# Altium footprint library Connectors.PcbLib: 135 footprints (part 2 of 9)
Each footprint in its own frame and in the unit in brackets; x right, y up, seen from the top. Pads: shape width x height; smd on the part's side, far side on the other; paste and mask are expansions set on the pad; w line width, h text height; cw(c..) or ccw(c..) is an arc to the next point about the centre after c.
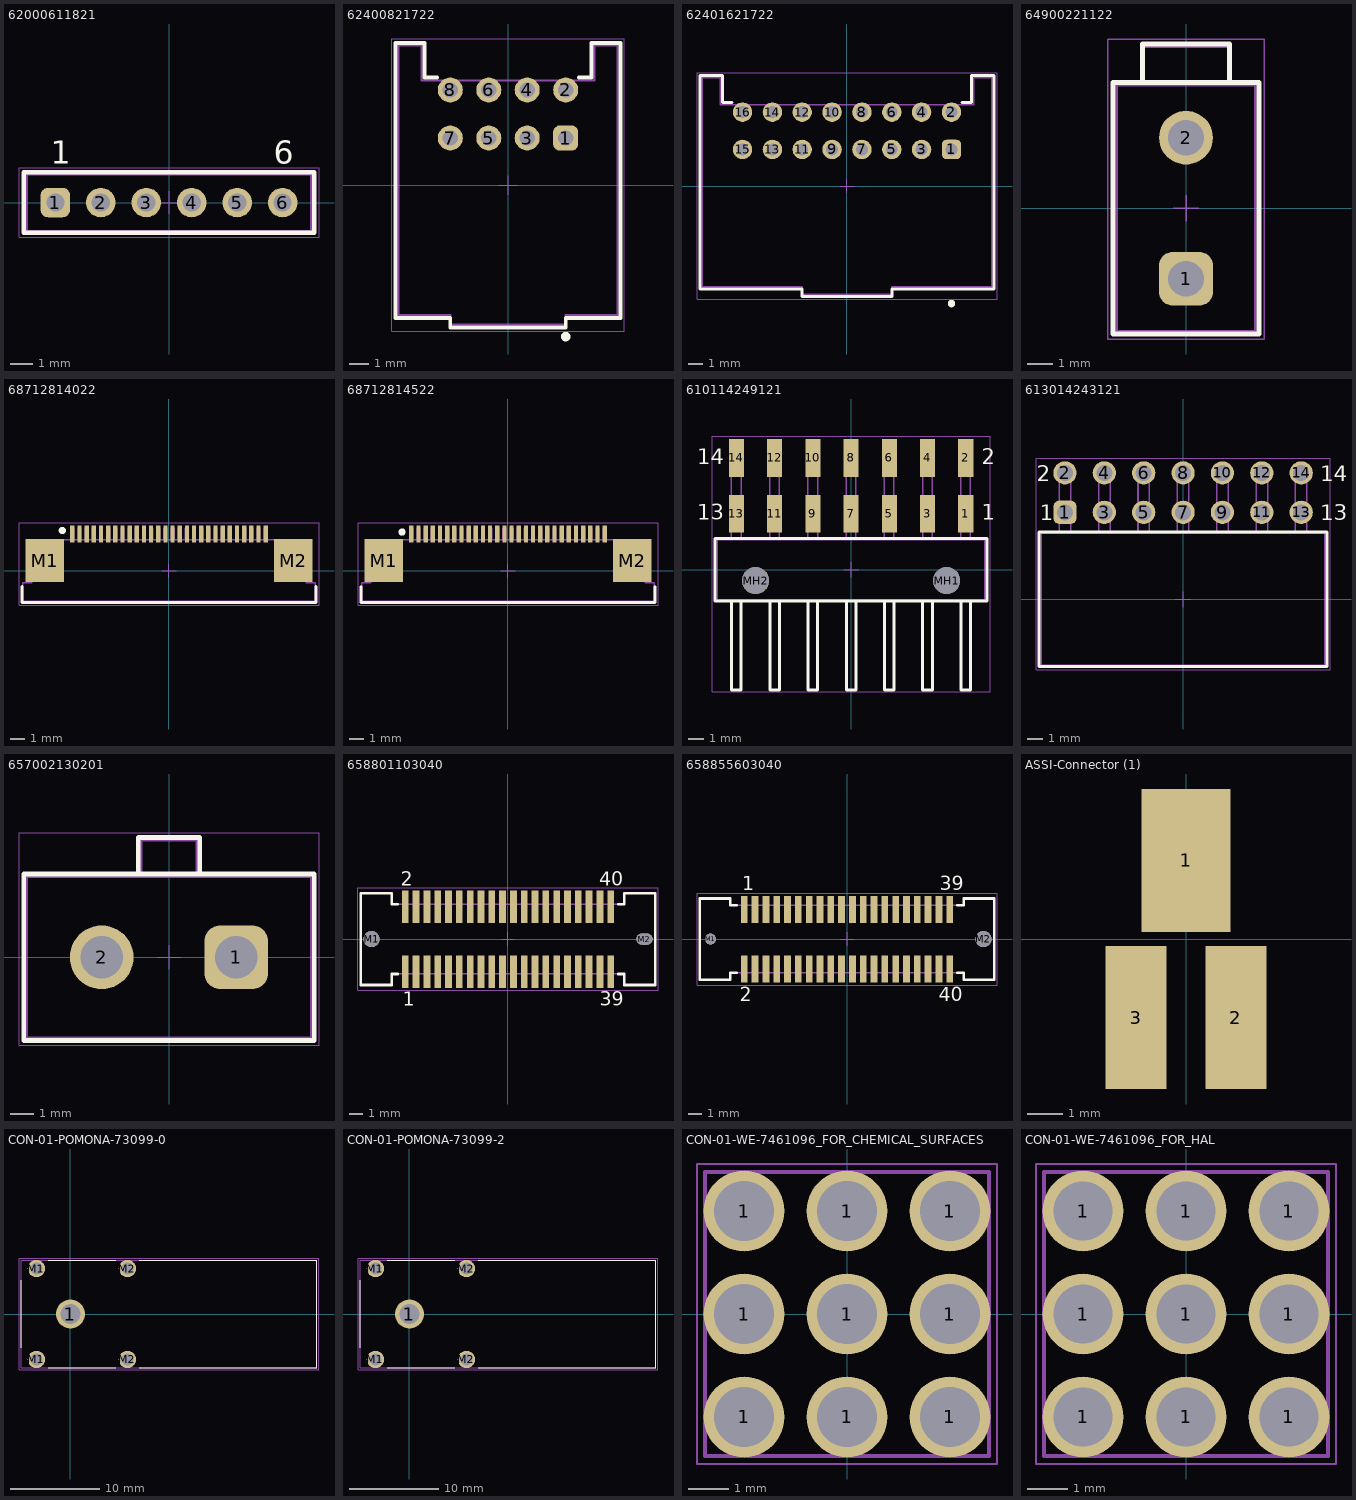
[diagram p1: the footprints below, top view; thin cyan lines are the x and y axes]

## 62000611821 [mm] "Socket Header, Pitch 2.00 mm, THT, Vertical, single row, 6p"
height 4.45
pads (6):
  rrect50% 1.3x1.3 hole 0.8: 1(-5,0)
  round 1.3 hole 0.8: 2(-3,0) 3(-1,0) 4(1,0) 5(3,0) 6(5,0)
Top Overlay:
  lines w0.2: -6.4,-1.325 6.4,-1.325 6.4,1.325 -6.4,1.325 -6.4,-1.325
  text "6" at 4.6,1.7 h1.02
  text "1" at -5.2,1.7 h1.02
Top Component Center:
  lines w0.05: -0.5,0 0.5,0 ; 0,-0.5 0,0.5
Top Component Outline:
  lines w0.1: -6.25,-1.25 6.25,-1.25 6.25,1.25 -6.25,1.25 -6.25,-1.25
Top Courtyard (Mech26):
  lines w0.05: -6.6,-1.525 6.6,-1.525 6.6,1.525 -6.6,1.525 -6.6,-1.525
Top Designator:
  text ".Designator" at -7.498,-0.5 h1.5
3D body "62000611821.stp": height 4.35, standoff -2.65, extent -6.25,-1.25 6.25,1.25

## 62400821722 [mm] "2.00mm Male Dual Row Horizontal Shrouded Header with positive locking, 8p"
height 11.7
pads (8):
  rrect50% 1.3x1.3 hole 0.8: 1(3,2.45)
  round 1.3 hole 0.8: 2(3,4.95) 3(1,2.45) 4(1,4.95) 5(-1,2.45) 6(-1,4.95) 7(-3,2.45) 8(-3,4.95)
Top Overlay:
  circle w0.25: c3,-7.875 r0.125
  lines w0.2: -3.7,5.6 -4.35,5.6 -4.35,7.4 -5.85,7.4 -5.85,-6.9 -3,-6.9 -3,-7.4 3,-7.4 3,-6.9 5.85,-6.9 5.85,7.4 4.35,7.4 4.35,5.6 3.7,5.6
Top Component Center:
  lines w0.05: -0.5,0 0.5,0 ; 0,-0.5 0,0.5
Top Component Outline:
  lines w0.1: -5.7,-6.75 -5.7,7.25 -4.5,7.25 -4.5,5.45 4.5,5.45 4.5,7.25 5.7,7.25 5.7,-6.75 3,-6.75 3,-7.25 -3,-7.25 -3,-6.75 -5.7,-6.75
Top Courtyard (Mech26):
  lines w0.05: -6.05,-7.6 -6.05,7.6 6.05,7.6 6.05,-7.6 -6.05,-7.6
Top Designator:
  text ".Designator" at -7.498,-0.5 h1.5
3D body "62400821722.stp": height 11.73, standoff -3.17, extent -5.7,-7.25 5.7,7.25

## 62401621722 [mm] "2.00mm Male Dual Row Horizontal Shrouded Header with positive locking, 16p"
height 11.7
pads (16):
  rrect50% 1.3x1.3 hole 0.8: 1(7,2.45)
  round 1.3 hole 0.8: 2(7,4.95) 3(5,2.45) 4(5,4.95) 5(3,2.45) 6(3,4.95) 7(1,2.45) 8(1,4.95) 9(-1,2.45) 10(-1,4.95) 11(-3,2.45) 12(-3,4.95) 13(-5,2.45) 14(-5,4.95) 15(-7,2.45) 16(-7,4.95)
Top Overlay:
  circle w0.25: c7,-7.875 r0.125
  lines w0.2: -7.7,5.6 -8.35,5.6 -8.35,7.4 -9.85,7.4 -9.85,-6.9 -3,-6.9 -3,-7.4 3,-7.4 3,-6.9 9.85,-6.9 9.85,7.4 8.35,7.4 8.35,5.6 7.7,5.6
Top Component Center:
  lines w0.05: -0.5,0 0.5,0 ; 0,-0.5 0,0.5
Top Component Outline:
  lines w0.1: -9.7,-6.75 -9.7,7.25 -8.5,7.25 -8.5,5.45 8.5,5.45 8.5,7.25 9.7,7.25 9.7,-6.75 3,-6.75 3,-7.25 -3,-7.25 -3,-6.75 -9.7,-6.75
Top Courtyard (Mech26):
  lines w0.05: -10.05,-7.6 -10.05,7.6 10.05,7.6 10.05,-7.6 -10.05,-7.6
Top Designator:
  text ".Designator" at -7.498,-0.5 h1.5
3D body "62401621722.stp": height 11.73, standoff -3.17, extent -9.7,-7.25 9.7,7.25

## 64900221122 [mm] "4.20mm Male Dual Row Vertical Header, 2p"
height 12.8
pads (2):
  rrect50% 2.1x2.1 hole 1.4: 1(0,-2.75)
  round 2.1 hole 1.4: 2(0,2.75)
Top Overlay:
  lines w0.2: -1.7,4.9 -1.7,6.4 1.7,6.4 1.7,4.9 ; -2.85,-4.9 2.85,-4.9 2.85,4.9 -2.85,4.9 -2.85,-4.9
Top Component Outline:
  lines w0.1: -1.7,4.8 -1.7,6.3 1.7,6.3 1.7,4.8 ; 2.7,4.8 -2.7,4.8 -2.7,-4.8 2.7,-4.8 2.7,4.8 ; 2.7,4.8 2.7,4.8
Top Courtyard (Mech26):
  lines w0.05: -0.5,0 0.5,0 ; 0,-0.5 0,0.5 ; -3.05,-5.1 -3.05,6.6 3.05,6.6 3.05,-5.1 -3.05,-5.1
Top Designator:
  text ".Designator" at -7.498,-0.5 h1.5
3D body "64900221122.stp": height 12.85, standoff -3.45, extent -2.7,-4.8 3.096,6.3

## 68712814022 [mm] "ZIF Connectors, Horizontal, Top Contact, pitch 0.5mm, 28p"
height 2.25
pads (30):
  rect 0.3x1.2 smd mask+0: 1(-6.75,2.56) 2(-6.25,2.56) 3(-5.75,2.56) 4(-5.25,2.56) 5(-4.75,2.56) 6(-4.25,2.56) 7(-3.75,2.56) 8(-3.25,2.56) 9(-2.75,2.56) 10(-2.25,2.56) 11(-1.75,2.56) 12(-1.25,2.56) 13(-0.75,2.56) 14(-0.25,2.56) 15(0.25,2.56) 16(0.75,2.56) 17(1.25,2.56) 18(1.75,2.56) 19(2.25,2.56) 20(2.75,2.56) 21(3.25,2.56) 22(3.75,2.56) 23(4.25,2.56) 24(4.75,2.56) 25(5.25,2.56) 26(5.75,2.56) 27(6.25,2.56) 28(6.75,2.56)
  rect 2.7x3 smd mask+0: M1(-8.68,0.7) M2(8.68,0.7)
Top Overlay:
  circle w0.25: c-7.45,2.8 r0.125
  lines w0.2: -10.275,-1.1 -10.275,-2.225 10.275,-2.225 10.275,-1.1
Top 3D Body (Mech20):
  lines w0.1: -6.85,2.15 -6.85,2.95 -6.65,2.95 -6.65,2.15 ; -6.35,2.15 -6.35,2.95 -6.15,2.95 -6.15,2.15 ; -5.85,2.15 -5.85,2.95 -5.65,2.95 -5.65,2.15 ; -5.35,2.15 -5.35,2.95 -5.15,2.95 -5.15,2.15 ; -4.85,2.15 -4.85,2.95 -4.65,2.95 -4.65,2.15 ; -4.35,2.15 -4.35,2.95 -4.15,2.95 -4.15,2.15 ; -3.85,2.15 -3.85,2.95 -3.65,2.95 -3.65,2.15 ; -3.35,2.15 -3.35,2.95 -3.15,2.95 -3.15,2.15 ; -2.85,2.15 -2.85,2.95 -2.65,2.95 -2.65,2.15 ; -2.35,2.15 -2.35,2.95 -2.15,2.95 -2.15,2.15 ; -1.85,2.15 -1.85,2.95 -1.65,2.95 -1.65,2.15 ; -1.35,2.15 -1.35,2.95 -1.15,2.95 -1.15,2.15 ; -0.85,2.15 -0.85,2.95 -0.65,2.95 -0.65,2.15 ; -0.35,2.15 -0.35,2.95 -0.15,2.95 -0.15,2.15 ; 0.15,2.15 0.15,2.95 0.35,2.95 0.35,2.15 ; 0.65,2.15 0.65,2.95 0.85,2.95 0.85,2.15 ; 1.15,2.15 1.15,2.95 1.35,2.95 1.35,2.15 ; 1.65,2.15 1.65,2.95 1.85,2.95 1.85,2.15 ; 2.15,2.15 2.15,2.95 2.35,2.95 2.35,2.15 ; 2.65,2.15 2.65,2.95 2.85,2.95 2.85,2.15 ; 3.15,2.15 3.15,2.95 3.35,2.95 3.35,2.15 ; 3.65,2.15 3.65,2.95 3.85,2.95 3.85,2.15 ; 4.15,2.15 4.15,2.95 4.35,2.95 4.35,2.15 ; 4.65,2.15 4.65,2.95 4.85,2.95 4.85,2.15 ; 5.15,2.15 5.15,2.95 5.35,2.95 5.35,2.15 ; 5.65,2.15 5.65,2.95 5.85,2.95 5.85,2.15 ; 6.15,2.15 6.15,2.95 6.35,2.95 6.35,2.15 ; 6.65,2.15 6.65,2.95 6.85,2.95 6.85,2.15 ; -10.2,-2.15 -10.2,-0.85 -9.6,-0.85 -9.6,2.15 9.6,2.15 9.6,-0.85 10.2,-0.85 10.2,-2.15 -10.2,-2.15
Top Component Outline:
  lines w0.1: -6.85,2.15 -6.85,2.95 -6.65,2.95 -6.65,2.15 ; -6.35,2.15 -6.35,2.95 -6.15,2.95 -6.15,2.15 ; -5.85,2.15 -5.85,2.95 -5.65,2.95 -5.65,2.15 ; -5.35,2.15 -5.35,2.95 -5.15,2.95 -5.15,2.15 ; -4.85,2.15 -4.85,2.95 -4.65,2.95 -4.65,2.15 ; -4.35,2.15 -4.35,2.95 -4.15,2.95 -4.15,2.15 ; -3.85,2.15 -3.85,2.95 -3.65,2.95 -3.65,2.15 ; -3.35,2.15 -3.35,2.95 -3.15,2.95 -3.15,2.15 ; -2.85,2.15 -2.85,2.95 -2.65,2.95 -2.65,2.15 ; -2.35,2.15 -2.35,2.95 -2.15,2.95 -2.15,2.15 ; -1.85,2.15 -1.85,2.95 -1.65,2.95 -1.65,2.15 ; -1.35,2.15 -1.35,2.95 -1.15,2.95 -1.15,2.15 ; -0.85,2.15 -0.85,2.95 -0.65,2.95 -0.65,2.15 ; -0.35,2.15 -0.35,2.95 -0.15,2.95 -0.15,2.15 ; 0.15,2.15 0.15,2.95 0.35,2.95 0.35,2.15 ; 0.65,2.15 0.65,2.95 0.85,2.95 0.85,2.15 ; 1.15,2.15 1.15,2.95 1.35,2.95 1.35,2.15 ; 1.65,2.15 1.65,2.95 1.85,2.95 1.85,2.15 ; 2.15,2.15 2.15,2.95 2.35,2.95 2.35,2.15 ; 2.65,2.15 2.65,2.95 2.85,2.95 2.85,2.15 ; 3.15,2.15 3.15,2.95 3.35,2.95 3.35,2.15 ; 3.65,2.15 3.65,2.95 3.85,2.95 3.85,2.15 ; 4.15,2.15 4.15,2.95 4.35,2.95 4.35,2.15 ; 4.65,2.15 4.65,2.95 4.85,2.95 4.85,2.15 ; 5.15,2.15 5.15,2.95 5.35,2.95 5.35,2.15 ; 5.65,2.15 5.65,2.95 5.85,2.95 5.85,2.15 ; 6.15,2.15 6.15,2.95 6.35,2.95 6.35,2.15 ; 6.65,2.15 6.65,2.95 6.85,2.95 6.85,2.15 ; -10.2,-2.15 10.2,-2.15 10.2,-0.85 9.6,-0.85 9.6,2.15 -9.6,2.15 -9.6,-0.85 -10.2,-0.85 -10.2,-2.15
Top Courtyard (Mech26):
  lines w0.05: -0.5,0 0.5,0 ; 0,-0.5 0,0.5 ; -10.475,-2.425 10.475,-2.425 10.475,3.36 -10.475,3.36 -10.475,-2.425
Top Designator:
  text ".Designator" at -7.498,-0.5 h1.5
3D body "68712814022.stp": height 2.1, standoff 0, extent -10.2,-2.15 10.2,2.95

## 68712814522 [mm] "ZIF Connectors, Horizontal, Bottom Contact, pitch 0.5mm, 28p"
height 2.25
pads (30):
  rect 0.3x1.2 smd mask+0: 1(-6.75,2.56) 2(-6.25,2.56) 3(-5.75,2.56) 4(-5.25,2.56) 5(-4.75,2.56) 6(-4.25,2.56) 7(-3.75,2.56) 8(-3.25,2.56) 9(-2.75,2.56) 10(-2.25,2.56) 11(-1.75,2.56) 12(-1.25,2.56) 13(-0.75,2.56) 14(-0.25,2.56) 15(0.25,2.56) 16(0.75,2.56) 17(1.25,2.56) 18(1.75,2.56) 19(2.25,2.56) 20(2.75,2.56) 21(3.25,2.56) 22(3.75,2.56) 23(4.25,2.56) 24(4.75,2.56) 25(5.25,2.56) 26(5.75,2.56) 27(6.25,2.56) 28(6.75,2.56)
  rect 2.7x3 smd mask+0: M1(-8.68,0.7) M2(8.68,0.7)
Top Overlay:
  circle w0.25: c-7.4,2.7 r0.125
  lines w0.2: -10.275,-1.125 -10.275,-2.225 10.275,-2.225 10.275,-1.125
Top 3D Body (Mech20):
  lines w0.1: -6.85,2.15 -6.85,2.95 -6.65,2.95 -6.65,2.15 ; -6.35,2.15 -6.35,2.95 -6.15,2.95 -6.15,2.15 ; -5.85,2.15 -5.85,2.95 -5.65,2.95 -5.65,2.15 ; -5.35,2.15 -5.35,2.95 -5.15,2.95 -5.15,2.15 ; -4.85,2.15 -4.85,2.95 -4.65,2.95 -4.65,2.15 ; -4.35,2.15 -4.35,2.95 -4.15,2.95 -4.15,2.15 ; -3.85,2.15 -3.85,2.95 -3.65,2.95 -3.65,2.15 ; -3.35,2.15 -3.35,2.95 -3.15,2.95 -3.15,2.15 ; -2.85,2.15 -2.85,2.95 -2.65,2.95 -2.65,2.15 ; -2.35,2.15 -2.35,2.95 -2.15,2.95 -2.15,2.15 ; -1.85,2.15 -1.85,2.95 -1.65,2.95 -1.65,2.15 ; -1.35,2.15 -1.35,2.95 -1.15,2.95 -1.15,2.15 ; -0.85,2.15 -0.85,2.95 -0.65,2.95 -0.65,2.15 ; -0.35,2.15 -0.35,2.95 -0.15,2.95 -0.15,2.15 ; 0.15,2.15 0.15,2.95 0.35,2.95 0.35,2.15 ; 0.65,2.15 0.65,2.95 0.85,2.95 0.85,2.15 ; 1.15,2.15 1.15,2.95 1.35,2.95 1.35,2.15 ; 1.65,2.15 1.65,2.95 1.85,2.95 1.85,2.15 ; 2.15,2.15 2.15,2.95 2.35,2.95 2.35,2.15 ; 2.65,2.15 2.65,2.95 2.85,2.95 2.85,2.15 ; 3.15,2.15 3.15,2.95 3.35,2.95 3.35,2.15 ; 3.65,2.15 3.65,2.95 3.85,2.95 3.85,2.15 ; 4.15,2.15 4.15,2.95 4.35,2.95 4.35,2.15 ; 4.65,2.15 4.65,2.95 4.85,2.95 4.85,2.15 ; 5.15,2.15 5.15,2.95 5.35,2.95 5.35,2.15 ; 5.65,2.15 5.65,2.95 5.85,2.95 5.85,2.15 ; 6.15,2.15 6.15,2.95 6.35,2.95 6.35,2.15 ; 6.65,2.15 6.65,2.95 6.85,2.95 6.85,2.15 ; -10.2,-2.15 -10.2,-0.85 -9.6,-0.85 -9.6,2.15 9.6,2.15 9.6,-0.85 10.2,-0.85 10.2,-2.15 -10.2,-2.15
Top Component Outline:
  lines w0.1: -6.85,2.15 -6.85,2.95 -6.65,2.95 -6.65,2.15 ; -6.35,2.15 -6.35,2.95 -6.15,2.95 -6.15,2.15 ; -5.85,2.15 -5.85,2.95 -5.65,2.95 -5.65,2.15 ; -5.35,2.15 -5.35,2.95 -5.15,2.95 -5.15,2.15 ; -4.85,2.15 -4.85,2.95 -4.65,2.95 -4.65,2.15 ; -4.35,2.15 -4.35,2.95 -4.15,2.95 -4.15,2.15 ; -3.85,2.15 -3.85,2.95 -3.65,2.95 -3.65,2.15 ; -3.35,2.15 -3.35,2.95 -3.15,2.95 -3.15,2.15 ; -2.85,2.15 -2.85,2.95 -2.65,2.95 -2.65,2.15 ; -2.35,2.15 -2.35,2.95 -2.15,2.95 -2.15,2.15 ; -1.85,2.15 -1.85,2.95 -1.65,2.95 -1.65,2.15 ; -1.35,2.15 -1.35,2.95 -1.15,2.95 -1.15,2.15 ; -0.85,2.15 -0.85,2.95 -0.65,2.95 -0.65,2.15 ; -0.35,2.15 -0.35,2.95 -0.15,2.95 -0.15,2.15 ; 0.15,2.15 0.15,2.95 0.35,2.95 0.35,2.15 ; 0.65,2.15 0.65,2.95 0.85,2.95 0.85,2.15 ; 1.15,2.15 1.15,2.95 1.35,2.95 1.35,2.15 ; 1.65,2.15 1.65,2.95 1.85,2.95 1.85,2.15 ; 2.15,2.15 2.15,2.95 2.35,2.95 2.35,2.15 ; 2.65,2.15 2.65,2.95 2.85,2.95 2.85,2.15 ; 3.15,2.15 3.15,2.95 3.35,2.95 3.35,2.15 ; 3.65,2.15 3.65,2.95 3.85,2.95 3.85,2.15 ; 4.15,2.15 4.15,2.95 4.35,2.95 4.35,2.15 ; 4.65,2.15 4.65,2.95 4.85,2.95 4.85,2.15 ; 5.15,2.15 5.15,2.95 5.35,2.95 5.35,2.15 ; 5.65,2.15 5.65,2.95 5.85,2.95 5.85,2.15 ; 6.15,2.15 6.15,2.95 6.35,2.95 6.35,2.15 ; 6.65,2.15 6.65,2.95 6.85,2.95 6.85,2.15 ; -10.2,-2.15 10.2,-2.15 10.2,-0.85 9.6,-0.85 9.6,2.15 -9.6,2.15 -9.6,-0.85 -10.2,-0.85 -10.2,-2.15
Top Courtyard (Mech26):
  lines w0.05: -0.5,0 0.5,0 ; 0,-0.5 0,0.5 ; -10.475,-2.425 -10.475,3.36 10.475,3.36 10.475,-2.425 -10.475,-2.425
Top Designator:
  text ".Designator" at -7.498,-0.5 h1.5
3D body "68712814522.stp": height 2.1, standoff 0, extent -10.2,-2.15 10.2,2.95

## 610114249121 [mm] "Pin Header, pitch 2.54 mm, SMD, Angled, dual row, 14p"
height 5.08
pads (16):
  rect 1x2.5 smd: 1(7.62,3.72) 2(7.62,7.42) 3(5.08,3.72) 4(5.08,7.42) 5(2.54,3.72) 6(2.54,7.42) 7(0,3.72) 8(0,7.42) 9(-2.54,3.72) 10(-2.54,7.42) 11(-5.08,3.72) 12(-5.08,7.42) 13(-7.62,3.72) 14(-7.62,7.42)
  round 1.8 hole 1.8 unplated: MH1(6.35,-0.73) MH2(-6.35,-0.73)
Top Overlay:
  lines w0.2: -7.94,-2.075 -7.94,-8 -7.3,-8 -7.3,-2.075 ; -5.4,-2.075 -5.4,-8 -4.76,-8 -4.76,-2.075 ; -2.86,-2.075 -2.86,-8 -2.22,-8 -2.22,-2.075 ; -0.32,-2.075 -0.32,-8 0.32,-8 0.32,-2.075 ; 2.22,-2.075 2.22,-8 2.86,-8 2.86,-2.075 ; 4.76,-2.075 4.76,-8 5.4,-8 5.4,-2.075 ; 7.3,-2.075 7.3,-8 7.94,-8 7.94,-2.075 ; -9.04,-2.075 9.04,-2.075 9.04,2.075 -9.04,2.075 -9.04,-2.075
  text "1" at 8.68,3.3 h1.02
  text "2" at 8.68,7 h1.02
  text "14" at -10.24,7 h1.02
  text "13" at -10.24,3.3 h1.02
Top 3D Body (Mech20):
  lines w0.1: -7.95,2 -7.95,8.16 ; -7.95,4.135 -7.95,4.26 ; -7.95,4.48 -7.31,4.48 ; -7.95,7.535 -7.95,7.815 -7.95,8.16 ; -7.94,-2 -7.94,-8 -7.3,-8 -7.3,-2 ; -7.31,2 -7.31,8.16 ; -7.31,4.135 -7.31,4.26 ; -7.31,7.535 -7.31,7.815 -7.31,8.16 ; -5.41,2 -5.41,8.16 ; -5.41,4.135 -5.41,4.26 ; -5.41,4.48 -4.77,4.48 ; -5.41,7.535 -5.41,7.815 -5.41,8.16 ; -5.4,-2 -5.4,-8 -4.76,-8 -4.76,-2 ; -4.77,2 -4.77,8.16 ; -4.77,4.135 -4.77,4.26 ; -4.77,7.535 -4.77,7.815 -4.77,8.16 ; -2.87,2 -2.87,8.16 ; -2.87,4.135 -2.87,4.26 ; -2.87,4.48 -2.23,4.48 ; -2.87,7.535 -2.87,7.815 -2.87,8.16 ; -2.86,-2 -2.86,-8 -2.22,-8 -2.22,-2 ; -2.23,2 -2.23,8.16 ; -2.23,4.135 -2.23,4.26 ; -2.23,7.535 -2.23,7.815 -2.23,8.16 ; -0.33,2 -0.33,8.16 ; -0.33,4.135 -0.33,4.26 ; -0.33,4.48 0.31,4.48 ; -0.33,7.535 -0.33,7.815 -0.33,8.16 ; -0.32,-2 -0.32,-8 0.32,-8 0.32,-2 ; 0.31,2 0.31,8.16 ; 0.31,4.135 0.31,4.26 ; 0.31,7.535 0.31,7.815 0.31,8.16 ; 2.21,2 2.21,8.16 ; 2.21,4.135 2.21,4.26 ; 2.21,4.48 2.85,4.48 ; 2.21,7.535 2.21,7.815 2.21,8.16 ; 2.22,-2 2.22,-8 2.86,-8 2.86,-2 ; 2.85,2 2.85,8.16 ; 2.85,4.135 2.85,4.26 ; 2.85,7.535 2.85,7.815 2.85,8.16 ; 4.75,2 4.75,8.16 ; 4.75,4.135 4.75,4.26 ; 4.75,4.48 5.39,4.48 ; 4.75,7.535 4.75,7.815 4.75,8.16 ; 4.76,-2 4.76,-8 5.4,-8 5.4,-2 ; 5.39,2 5.39,8.16 ; 5.39,4.135 5.39,4.26 ; 5.39,7.535 5.39,7.815 5.39,8.16 ; 7.29,2 7.29,8.16 ; 7.29,4.135 7.29,4.26 ; 7.29,4.48 7.93,4.48 ; 7.29,7.535 7.29,7.815 7.29,8.16 ; 7.3,-2 7.3,-8 7.94,-8 7.94,-2 ; 7.93,2 7.93,8.16 ; 7.93,4.135 7.93,4.26 ; 7.93,7.535 7.93,7.815 7.93,8.16 ; -7.95,8.16 -7.31,8.16 ; -5.41,8.16 -4.77,8.16 ; -2.87,8.16 -2.23,8.16 ; -0.33,8.16 0.31,8.16 ; 2.21,8.16 2.85,8.16 ; 4.75,8.16 5.39,8.16 ; 7.29,8.16 7.93,8.16 ; -8.89,-2 -8.89,2 8.89,2 8.89,-2 -8.89,-2
Top Component Outline:
  lines w0.1: -7.95,2 -7.95,8.16 ; -7.95,4.135 -7.95,4.26 ; -7.95,4.48 -7.31,4.48 ; -7.95,7.535 -7.95,7.815 -7.95,8.16 ; -7.94,-2 -7.94,-8 -7.3,-8 -7.3,-2 ; -7.31,2 -7.31,8.16 ; -7.31,4.135 -7.31,4.26 ; -7.31,7.535 -7.31,7.815 -7.31,8.16 ; -5.41,2 -5.41,8.16 ; -5.41,4.135 -5.41,4.26 ; -5.41,4.48 -4.77,4.48 ; -5.41,7.535 -5.41,7.815 -5.41,8.16 ; -5.4,-2 -5.4,-8 -4.76,-8 -4.76,-2 ; -4.77,2 -4.77,8.16 ; -4.77,4.135 -4.77,4.26 ; -4.77,7.535 -4.77,7.815 -4.77,8.16 ; -2.87,2 -2.87,8.16 ; -2.87,4.135 -2.87,4.26 ; -2.87,4.48 -2.23,4.48 ; -2.87,7.535 -2.87,7.815 -2.87,8.16 ; -2.86,-2 -2.86,-8 -2.22,-8 -2.22,-2 ; -2.23,2 -2.23,8.16 ; -2.23,4.135 -2.23,4.26 ; -2.23,7.535 -2.23,7.815 -2.23,8.16 ; -0.33,2 -0.33,8.16 ; -0.33,4.135 -0.33,4.26 ; -0.33,4.48 0.31,4.48 ; -0.33,7.535 -0.33,7.815 -0.33,8.16 ; -0.32,-2 -0.32,-8 0.32,-8 0.32,-2 ; 0.31,2 0.31,8.16 ; 0.31,4.135 0.31,4.26 ; 0.31,7.535 0.31,7.815 0.31,8.16 ; 2.21,2 2.21,8.16 ; 2.21,4.135 2.21,4.26 ; 2.21,4.48 2.85,4.48 ; 2.21,7.535 2.21,7.815 2.21,8.16 ; 2.22,-2 2.22,-8 2.86,-8 2.86,-2 ; 2.85,2 2.85,8.16 ; 2.85,4.135 2.85,4.26 ; 2.85,7.535 2.85,7.815 2.85,8.16 ; 4.75,2 4.75,8.16 ; 4.75,4.135 4.75,4.26 ; 4.75,4.48 5.39,4.48 ; 4.75,7.535 4.75,7.815 4.75,8.16 ; 4.76,-2 4.76,-8 5.4,-8 5.4,-2 ; 5.39,2 5.39,8.16 ; 5.39,4.135 5.39,4.26 ; 5.39,7.535 5.39,7.815 5.39,8.16 ; 7.29,2 7.29,8.16 ; 7.29,4.135 7.29,4.26 ; 7.29,4.48 7.93,4.48 ; 7.29,7.535 7.29,7.815 7.29,8.16 ; 7.3,-2 7.3,-8 7.94,-8 7.94,-2 ; 7.93,2 7.93,8.16 ; 7.93,4.135 7.93,4.26 ; 7.93,7.535 7.93,7.815 7.93,8.16 ; -7.95,8.16 -7.31,8.16 ; -5.41,8.16 -4.77,8.16 ; -2.87,8.16 -2.23,8.16 ; -0.33,8.16 0.31,8.16 ; 2.21,8.16 2.85,8.16 ; 4.75,8.16 5.39,8.16 ; 7.29,8.16 7.93,8.16 ; -8.89,-2 -8.89,2 8.89,2 8.89,-2 -8.89,-2
Top Courtyard (Mech26):
  lines w0.05: -0.5,0 0.5,0 ; 0,-0.5 0,0.5 ; -9.24,-8.125 9.24,-8.125 9.24,8.87 -9.24,8.87 -9.24,-8.125
Top Designator:
  text ".Designator" at -7.498,-0.5 h1.5
3D body "610114249121.stp": height 5.1, standoff -1.38, extent -8.89,-8 8.89,8.16

## 613014243121 [mm] "Socket Header, Pitch 2.54 mm, THT, Angled, dual row, 14p"
height 5.08
pads (14):
  rrect50% 1.5x1.5 hole 1.03: 1(-7.62,5.61)
  round 1.5 hole 1.03: 2(-7.62,8.15) 3(-5.08,5.61) 4(-5.08,8.15) 5(-2.54,5.61) 6(-2.54,8.15) 7(0,5.61) 8(0,8.15) 9(2.54,5.61) 10(2.54,8.15) 11(5.08,5.61) 12(5.08,8.15) 13(7.62,5.61) 14(7.62,8.15)
Top Overlay:
  lines w0.2: -9.29,-4.35 -9.29,4.35 9.29,4.35 9.29,-4.35 -9.29,-4.35
  text "2" at -9.45,7.6 h1.02
  text "1" at -9.25,5.1 h1.02
  text "14" at 8.85,7.6 h1.02
  text "13" at 8.85,5.1 h1.02
Top 3D Body (Mech20):
  lines w0.1: -7.99,4.25 -7.99,8.35 -7.25,8.35 -7.25,4.25 ; -7.99,5.81 -7.25,5.81 ; -5.45,4.25 -5.45,8.35 -4.71,8.35 -4.71,4.25 ; -5.45,5.81 -4.71,5.81 ; -2.91,4.25 -2.91,8.35 -2.17,8.35 -2.17,4.25 ; -2.91,5.81 -2.17,5.81 ; -0.37,4.25 -0.37,8.35 0.37,8.35 0.37,4.25 ; -0.37,5.81 0.37,5.81 ; 2.17,4.25 2.17,8.35 2.91,8.35 2.91,4.25 ; 2.17,5.81 2.91,5.81 ; 4.71,4.25 4.71,8.35 5.45,8.35 5.45,4.25 ; 4.71,5.81 5.45,5.81 ; 7.25,4.25 7.25,8.35 7.99,8.35 7.99,4.25 ; 7.25,5.81 7.99,5.81 ; -9.14,-4.25 -9.14,4.25 9.14,4.25 9.14,-4.25 -9.14,-4.25
Top Component Outline:
  lines w0.1: -7.99,4.25 -7.99,8.35 -7.25,8.35 -7.25,4.25 ; -7.99,5.81 -7.25,5.81 ; -5.45,4.25 -5.45,8.35 -4.71,8.35 -4.71,4.25 ; -5.45,5.81 -4.71,5.81 ; -2.91,4.25 -2.91,8.35 -2.17,8.35 -2.17,4.25 ; -2.91,5.81 -2.17,5.81 ; -0.37,4.25 -0.37,8.35 0.37,8.35 0.37,4.25 ; -0.37,5.81 0.37,5.81 ; 2.17,4.25 2.17,8.35 2.91,8.35 2.91,4.25 ; 2.17,5.81 2.91,5.81 ; 4.71,4.25 4.71,8.35 5.45,8.35 5.45,4.25 ; 4.71,5.81 5.45,5.81 ; 7.25,4.25 7.25,8.35 7.99,8.35 7.99,4.25 ; 7.25,5.81 7.99,5.81 ; -9.14,-4.25 9.14,-4.25 9.14,4.25 -9.14,4.25 -9.14,-4.25
Top Courtyard (Mech26):
  lines w0.05: -0.5,0 0.5,0 ; 0,-0.5 0,0.5 ; -9.49,-4.55 9.49,-4.55 9.49,9.1 -9.49,9.1 -9.49,-4.55
Top Designator:
  text ".Designator" at -7.498,-0.5 h1.5
3D body "613014243121.stp": height 5.05, standoff -3.25, extent -9.14,-4.25 9.14,8.35

## 657002130201 [mm] "Single Row Male Header Vertical, 02p"
height 15.3
pads (2):
  rrect50% 2.7x2.7 hole 1.8: 1(2.85,0)
  round 2.7 hole 1.8: 2(-2.85,0)
Top Overlay:
  lines w0.2: -1.3,3.525 -1.3,5.075 1.3,5.075 1.3,3.525 ; -6.15,-3.525 6.15,-3.525 6.15,3.525 -6.15,3.525 -6.15,-3.525
Top Component Center:
  lines w0.05: -0.5,0 0.5,0 ; 0,-0.5 0,0.5
Top Component Outline:
  lines w0.1: -1.175,3.4 -1.175,4.95 1.175,4.95 1.175,3.4 ; -6.025,-3.4 6.025,-3.4 6.025,3.4 -6.025,3.4 -6.025,-3.4
Top Courtyard (Mech26):
  lines w0.05: -6.35,-3.725 -6.35,5.275 6.35,5.275 6.35,-3.725 -6.35,-3.725
Top Designator:
  text ".Designator" at -7.498,-0.5 h1.5
3D body "657002130201.stp": height 15.35, standoff -3.15, extent -6.025,-3.4 6.025,4.95

## 658801103040 [mm] "0.80mm SMT Female Shrouded Vertical Receptacle 11.75mm height, 40p"
height 11.75
pads (42):
  rect 0.5x2.4 smd: 1(-7.6,-2.4) 2(-7.6,2.4) 3(-6.8,-2.4) 4(-6.8,2.4) 5(-6,-2.4) 6(-6,2.4) 7(-5.2,-2.4) 8(-5.2,2.4) 9(-4.4,-2.4) 10(-4.4,2.4) 11(-3.6,-2.4) 12(-3.6,2.4) 13(-2.8,-2.4) 14(-2.8,2.4) 15(-2,-2.4) 16(-2,2.4) 17(-1.2,-2.4) 18(-1.2,2.4) 19(-0.4,-2.4) 20(-0.4,2.4) 21(0.4,-2.4) 22(0.4,2.4) 23(1.2,-2.4) 24(1.2,2.4) 25(2,-2.4) 26(2,2.4) 27(2.8,-2.4) 28(2.8,2.4) 29(3.6,-2.4) 30(3.6,2.4) 31(4.4,-2.4) 32(4.4,2.4) 33(5.2,-2.4) 34(5.2,2.4) 35(6,-2.4) 36(6,2.4) 37(6.8,-2.4) 38(6.8,2.4) 39(7.6,-2.4) 40(7.6,2.4)
  round 1.2 hole 1.2 unplated: M1(-10.1,0)
  oval 1.2x0.8 hole 0.8 slot 1.2 at 0 deg unplated: M2(10.1,0)
Top Overlay:
  lines w0.2: -8.15,-2.58 -8.6,-2.58 -8.6,-3.4 -10.9,-3.4 -10.9,3.4 -8.6,3.4 -8.6,2.58 -8.15,2.58 ; 8.15,2.58 8.6,2.58 8.6,3.4 10.9,3.4 10.9,-3.4 8.6,-3.4 8.6,-2.58 8.15,-2.58
  text "39" at 6.8,-4.95 h1.02
  text "40" at 6.75,3.95 h1.02
  text "2" at -7.95,3.95 h1.02
  text "1" at -7.8,-4.95 h1.02
Top 3D Body (Mech20):
  lines w0.1: -10.9,-3.4 -10.9,3.4 -8.6,3.4 -8.6,2.58 8.6,2.58 8.6,3.4 10.9,3.4 10.9,-3.4 8.6,-3.4 8.6,-2.58 -8.6,-2.58 -8.6,-3.4 -10.9,-3.4
Top Component Outline:
  lines w0.1: -10.9,-3.4 -8.6,-3.4 -8.6,-2.58 8.6,-2.58 8.6,-3.4 10.9,-3.4 10.9,3.4 8.6,3.4 8.6,2.58 -8.6,2.58 -8.6,3.4 -10.9,3.4 -10.9,-3.4
Top Courtyard (Mech26):
  lines w0.05: -0.5,0 0.5,0 ; 0,-0.5 0,0.5 ; -11.1,-3.8 11.1,-3.8 11.1,3.8 -11.1,3.8 -11.1,-3.8
Top Designator:
  text ".Designator" at -7.498,-0.5 h1.5
3D body "658801103040.stp": height 11.97, standoff -0.48, extent -10.9,-3.4 10.9,3.4

## 658855603040 [mm] "0.80mm SMT Male Shrouded Vertical Plug 5.60mm height, 40p"
height 5.6
pads (42):
  rect 0.5x2 smd: 1(-7.6,2.2) 2(-7.6,-2.2) 3(-6.8,2.2) 4(-6.8,-2.2) 5(-6,2.2) 6(-6,-2.2) 7(-5.2,2.2) 8(-5.2,-2.2) 9(-4.4,2.2) 10(-4.4,-2.2) 11(-3.6,2.2) 12(-3.6,-2.2) 13(-2.8,2.2) 14(-2.8,-2.2) 15(-2,2.2) 16(-2,-2.2) 17(-1.2,2.2) 18(-1.2,-2.2) 19(-0.4,2.2) 20(-0.4,-2.2) 21(0.4,2.2) 22(0.4,-2.2) 23(1.2,2.2) 24(1.2,-2.2) 25(2,2.2) 26(2,-2.2) 27(2.8,2.2) 28(2.8,-2.2) 29(3.6,2.2) 30(3.6,-2.2) 31(4.4,2.2) 32(4.4,-2.2) 33(5.2,2.2) 34(5.2,-2.2) 35(6,2.2) 36(6,-2.2) 37(6.8,2.2) 38(6.8,-2.2) 39(7.6,2.2) 40(7.6,-2.2)
  round 0.8 hole 0.8 unplated: M1(-10.1,0)
  round 1.2 hole 1.2 unplated: M2(10.1,0)
Top Overlay:
  lines w0.2: -8.15,-2.5 -8.65,-2.5 -8.65,-3 -10.9,-3 -10.9,3 -8.65,3 -8.65,2.5 -8.15,2.5 ; 8.15,-2.5 8.65,-2.5 8.65,-3 10.9,-3 10.9,3 8.65,3 8.65,2.5 8.15,2.5
  text "2" at -7.95,-4.6 h1.02
  text "1" at -7.75,3.6 h1.02
  text "39" at 6.85,3.6 h1.02
  text "40" at 6.8,-4.6 h1.02
Top 3D Body (Mech20):
  lines w0.1: -10.9,-3 -10.9,3 -8.65,3 -8.65,2.5 8.65,2.5 8.65,3 10.9,3 10.9,-3 8.65,-3 8.65,-2.5 -8.65,-2.5 -8.65,-3 -10.9,-3
Top Component Outline:
  lines w0.1: -10.9,-3 -8.65,-3 -8.65,-2.5 8.65,-2.5 8.65,-3 10.9,-3 10.9,3 8.65,3 8.65,2.5 -8.65,2.5 -8.65,3 -10.9,3 -10.9,-3
Top Courtyard (Mech26):
  lines w0.05: -0.5,0 0.5,0 ; 0,-0.5 0,0.5 ; -11.1,-3.4 -11.1,3.4 11.1,3.4 11.1,-3.4 -11.1,-3.4
Top Designator:
  text ".Designator" at -7.498,-0.5 h1.5
3D body "658855603040.stp": height 5.85, standoff -0.45, extent -10.9,-3.35 10.9,3.35

## ASSI-Connector (1) [mm]
height 2
pads (3):
  rect 2.5x4 smd paste+0 mask+0: 1(0,2.2)
  rect 1.7x4 smd paste+0 mask+0: 2(1.4,-2.2) 3(-1.4,-2.2)

## CON-01-POMONA-73099-0 [mm] "Model 73099-0 Black / Right-Angle Mounting Safety Jack for PCB"
height 11.5
pads (5):
  round 3.216 hole 2.2: 1(0,0)
  round 1.95 hole 1.3: M1(-3.8,-5.08) M1(-3.8,5.08) M2(6.36,-5.08) M2(6.36,5.08)
Top Overlay:
  lines w0.127: -5.5,-3.78 -5.5,3.78 ; -2.5,-6 5.07,-6 ; -2.5,6 5.07,6 ; 7.66,-6 27.5,-6 27.5,6 7.66,6
Top Component Outline:
  lines w0.127: -5.5,-6 27.5,-6 27.5,6 -5.5,6 -5.5,-6
Top Courtyard (Mech26):
  lines w0.05: -5.75,-6.25 -5.75,6.25 27.75,6.25 27.75,-6.25 -5.75,-6.25
3D body "step_temp.STEP": height 11.51, standoff -3.4, extent -5.512,-5.994 27.483,5.994

## CON-01-POMONA-73099-2 [mm] "Model 73099-2 Red / Right-Angle Mounting Safety Jack for PCB"
height 11.5
pads (5):
  round 3.216 hole 2.2: 1(0,0)
  round 1.95 hole 1.3: M1(-3.8,-5.08) M1(-3.8,5.08) M2(6.36,-5.08) M2(6.36,5.08)
Top Overlay:
  lines w0.127: -5.5,-3.78 -5.5,3.78 ; -2.5,-6 5.07,-6 ; -2.5,6 5.07,6 ; 7.66,-6 27.5,-6 27.5,6 7.66,6
Top Component Outline:
  lines w0.127: -5.5,-6 27.5,-6 27.5,6 -5.5,6 -5.5,-6
Top Courtyard (Mech26):
  lines w0.05: -5.75,-6.25 -5.75,6.25 27.75,6.25 27.75,-6.25 -5.75,-6.25
3D body "73099-2-red.stp": height 11.51, standoff -3.4, extent -5.497,-5.994 27.497,5.994

## CON-01-WE-7461096_FOR_CHEMICAL_SURFACES [mm] "M4, thread 6mm"
height 9
pads (9):
  round 2 hole 1.475: 1(-2.54,-2.54) 1(-2.54,0) 1(-2.54,2.54) 1(0,-2.54) 1(0,0) 1(0,2.54) 1(2.54,-2.54) 1(2.54,0) 1(2.54,2.54)
Top Component Center:
  lines w0.05: -0.5,0 0.5,0 ; 0,-0.5 0,0.5
Top Component Outline:
  lines w0.1: -3.5,-3.5 -3.5,3.5 3.5,3.5 3.5,-3.5 -3.5,-3.5
Top Courtyard (Mech26):
  lines w0.05: -3.7,-3.7 -3.7,3.7 3.7,3.7 3.7,-3.7 -3.7,-3.7
3D body "7461096.stp": height 9, standoff -3.5, extent -3.5,-3.5 3.5,3.5

## CON-01-WE-7461096_FOR_HAL [mm] "M4, thread 6mm"
height 9
pads (9):
  round 2 hole 1.45: 1(-2.54,-2.54) 1(-2.54,0) 1(-2.54,2.54) 1(0,-2.54) 1(0,0) 1(0,2.54) 1(2.54,-2.54) 1(2.54,0) 1(2.54,2.54)
Top Component Center:
  lines w0.05: -0.5,0 0.5,0 ; 0,-0.5 0,0.5
Top Component Outline:
  lines w0.1: -3.5,-3.5 -3.5,3.5 3.5,3.5 3.5,-3.5 -3.5,-3.5
Top Courtyard (Mech26):
  lines w0.05: -3.7,-3.7 -3.7,3.7 3.7,3.7 3.7,-3.7 -3.7,-3.7
3D body "7461096.stp": height 9, standoff -3.5, extent -3.5,-3.5 3.5,3.5